# Altium integrated library Altium_WCAP-ATUL_rev19a.IntLib: 117 symbols (continued)
## 860040575009
designator C?, comment 330uF, 35V
WCAP-ATUL THT Aluminum Electrolytic Capacitors, D10mm x L16mm, 330uF, +/-20%, 35VDC; Part Number: 860040575009; Dissipation Factor: 12%; Endurance: 7000h; Leakage Current: 115.5uA; Ripple Current max.: 1380mA; Technical Reference: ATDF160331M035DSPAAG000; ComponentLink1Description: Manufacturer; ComponentLink1URL: http://www.we-online.de; ComponentLink2Description: Datasheet; ComponentLink2URL: https://katalog.we-online.com/pbs/datasheet/860040575009.pdf; Length: 16mm; Mounting Technology: THT; Operating Temperature: -40 to +105degC; Packaging: Ammo Pack; Published Date: August 2019; Capacitance: 330uF; Diameter: 10mm; Publisher: Wurth Elektronik; Capacitance Tolerance: +/-20%; Rated Voltage: 35VDC
footprint WCAP-ATUL_10x16
pins: 1 N, 2 P

## 860040575010
designator C?, comment 470uF, 35V
WCAP-ATUL THT Aluminum Electrolytic Capacitors, D10mm x L20mm, 470uF, +/-20%, 35VDC; Part Number: 860040575010; Dissipation Factor: 12%; Endurance: 7000h; Leakage Current: 164.5uA; Ripple Current max.: 1800mA; Technical Reference: ATDF200471M035DSPAAG000; ComponentLink1Description: Manufacturer; ComponentLink1URL: http://www.we-online.de; ComponentLink2Description: Datasheet; ComponentLink2URL: https://katalog.we-online.com/pbs/datasheet/860040575010.pdf; Length: 20mm; Mounting Technology: THT; Operating Temperature: -40 to +105degC; Packaging: Ammo Pack; Published Date: August 2019; Capacitance: 470uF; Diameter: 10mm; Publisher: Wurth Elektronik; Capacitance Tolerance: +/-20%; Rated Voltage: 35VDC
footprint WCAP-ATUL_10x20
pins: 1 N, 2 P

## 860040575011
designator C?, comment 560uF, 35V
WCAP-ATUL THT Aluminum Electrolytic Capacitors, D10mm x L25mm, 560uF, +/-20%, 35VDC; Part Number: 860040575011; Dissipation Factor: 12%; Endurance: 7000h; Leakage Current: 196uA; Ripple Current max.: 1900mA; Technical Reference: ATDF250561M035DSPAAG000; ComponentLink1Description: Manufacturer; ComponentLink1URL: http://www.we-online.de; ComponentLink2Description: Datasheet; ComponentLink2URL: https://katalog.we-online.com/pbs/datasheet/860040575011.pdf; Length: 25mm; Mounting Technology: THT; Operating Temperature: -40 to +105degC; Packaging: Ammo Pack; Published Date: August 2019; Capacitance: 560uF; Diameter: 10mm; Publisher: Wurth Elektronik; Capacitance Tolerance: +/-20%; Rated Voltage: 35VDC
footprint WCAP-ATUL_10x25
pins: 1 N, 2 P

## 860040575012
designator C?, comment 680uF, 35V
WCAP-ATUL THT Aluminum Electrolytic Capacitors, D10mm x L30mm, 680uF, +/-20%, 35VDC; Part Number: 860040575012; Dissipation Factor: 12%; Endurance: 7000h; Leakage Current: 238uA; Ripple Current max.: 2000mA; Technical Reference: ATDF300681M035DSPAAG000; ComponentLink1Description: Manufacturer; ComponentLink1URL: http://www.we-online.de; ComponentLink2Description: Datasheet; ComponentLink2URL: https://katalog.we-online.com/pbs/datasheet/860040575012.pdf; Length: 30mm; Mounting Technology: THT; Operating Temperature: -40 to +105degC; Packaging: Ammo Pack; Published Date: August 2019; Capacitance: 680uF; Diameter: 10mm; Publisher: Wurth Elektronik; Capacitance Tolerance: +/-20%; Rated Voltage: 35VDC
footprint WCAP-ATUL_10x30
pins: 1 N, 2 P

## 860040578013
designator C?, comment 680uF, 35V
WCAP-ATUL THT Aluminum Electrolytic Capacitors, D13mm x L20mm, 680uF, +/-20%, 35VDC; Part Number: 860040578013; Dissipation Factor: 12%; Endurance: 10000h; Leakage Current: 238uA; Ripple Current max.: 2100mA; Technical Reference: ATDI200681M035DSPACK000; ComponentLink1Description: Manufacturer; ComponentLink1URL: http://www.we-online.de; ComponentLink2Description: Datasheet; ComponentLink2URL: https://katalog.we-online.com/pbs/datasheet/860040578013.pdf; Length: 20mm; Mounting Technology: THT; Operating Temperature: -40 to +105degC; Packaging: Ammo Pack; Published Date: August 2019; Capacitance: 680uF; Diameter: 13mm; Publisher: Wurth Elektronik; Capacitance Tolerance: +/-20%; Rated Voltage: 35VDC
footprint WCAP-ATUL_13x20
pins: 1 N, 2 P

## 860040578014
designator C?, comment 1000uF, 35V
WCAP-ATUL THT Aluminum Electrolytic Capacitors, D13mm x L25mm, 1000uF, +/-20%, 35VDC; Part Number: 860040578014; Dissipation Factor: 12%; Endurance: 10000h; Leakage Current: 350uA; Ripple Current max.: 2400mA; Technical Reference: ATDI250102M035DSPACK000; ComponentLink1Description: Manufacturer; ComponentLink1URL: http://www.we-online.de; ComponentLink2Description: Datasheet; ComponentLink2URL: https://katalog.we-online.com/pbs/datasheet/860040578014.pdf; Length: 25mm; Mounting Technology: THT; Operating Temperature: -40 to +105degC; Packaging: Ammo Pack; Published Date: August 2019; Capacitance: 1000uF; Diameter: 13mm; Publisher: Wurth Elektronik; Capacitance Tolerance: +/-20%; Rated Voltage: 35VDC
footprint WCAP-ATUL_13x25
pins: 1 N, 2 P

## 860040578015
designator C?, comment 1200uF, 35V
WCAP-ATUL THT Aluminum Electrolytic Capacitors, D13mm x L30mm, 1200uF, +/-20%, 35VDC; Part Number: 860040578015; Dissipation Factor: 12%; Endurance: 10000h; Leakage Current: 420uA; Ripple Current max.: 2800mA; Technical Reference: ATDI300122M035DSPACK000; ComponentLink1Description: Manufacturer; ComponentLink1URL: http://www.we-online.de; ComponentLink2Description: Datasheet; ComponentLink2URL: https://katalog.we-online.com/pbs/datasheet/860040578015.pdf; Length: 30mm; Mounting Technology: THT; Operating Temperature: -40 to +105degC; Packaging: Ammo Pack; Published Date: August 2019; Capacitance: 1200uF; Diameter: 13mm; Publisher: Wurth Elektronik; Capacitance Tolerance: +/-20%; Rated Voltage: 35VDC
footprint WCAP-ATUL_13x30
pins: 1 N, 2 P

## 860040578017
designator C?, comment 1500uF, 35V
WCAP-ATUL THT Aluminum Electrolytic Capacitors, D13mm x L35mm, 1500uF, +/-20%, 35VDC; Part Number: 860040578017; Dissipation Factor: 12%; Endurance: 10000h; Leakage Current: 525uA; Ripple Current max.: 3000mA; Technical Reference: ATDI350152M035DSPABK000; ComponentLink1Description: Manufacturer; ComponentLink1URL: http://www.we-online.de; ComponentLink2Description: Datasheet; ComponentLink2URL: https://katalog.we-online.com/pbs/datasheet/860040578017.pdf; Length: 35mm; Mounting Technology: THT; Operating Temperature: -40 to +105degC; Packaging: Ammo Pack; Published Date: August 2019; Capacitance: 1500uF; Diameter: 13mm; Publisher: Wurth Elektronik; Capacitance Tolerance: +/-20%; Rated Voltage: 35VDC
footprint WCAP-ATUL_13x35
pins: 1 N, 2 P

## 860040580016
designator C?, comment 1200uF, 35V
WCAP-ATUL THT Aluminum Electrolytic Capacitors, D16mm x L21mm, 1200uF, +/-20%, 35VDC; Part Number: 860040580016; Dissipation Factor: 12%; Endurance: 10000h; Leakage Current: 420uA; Ripple Current max.: 2800mA; Technical Reference: ATDK210122M035DSPAEK000; ComponentLink1Description: Manufacturer; ComponentLink1URL: http://www.we-online.de; ComponentLink2Description: Datasheet; ComponentLink2URL: https://katalog.we-online.com/pbs/datasheet/860040580016.pdf; Length: 21mm; Mounting Technology: THT; Operating Temperature: -40 to +105degC; Packaging: Ammo Pack; Published Date: August 2019; Capacitance: 1200uF; Diameter: 16mm; Publisher: Wurth Elektronik; Capacitance Tolerance: +/-20%; Rated Voltage: 35VDC
footprint WCAP-ATUL_16x21
pins: 1 N, 2 P

## 860040580018
designator C?, comment 1800uF, 35V
WCAP-ATUL THT Aluminum Electrolytic Capacitors, D16mm x L25mm, 1800uF, +/-20%, 35VDC; Part Number: 860040580018; Dissipation Factor: 12%; Endurance: 10000h; Leakage Current: 630uA; Ripple Current max.: 2800mA; Technical Reference: ATDK250182M035DSPAEK000; ComponentLink1Description: Manufacturer; ComponentLink1URL: http://www.we-online.de; ComponentLink2Description: Datasheet; ComponentLink2URL: https://katalog.we-online.com/pbs/datasheet/860040580018.pdf; Length: 25mm; Mounting Technology: THT; Operating Temperature: -40 to +105degC; Packaging: Ammo Pack; Published Date: August 2019; Capacitance: 1800uF; Diameter: 16mm; Publisher: Wurth Elektronik; Capacitance Tolerance: +/-20%; Rated Voltage: 35VDC
footprint WCAP-ATUL_16x25
pins: 1 N, 2 P

## 860040580019
designator C?, comment 2700uF, 35V
WCAP-ATUL THT Aluminum Electrolytic Capacitors, D16mm x L35.5mm, 2700uF, +/-20%, 35VDC; Part Number: 860040580019; Dissipation Factor: 14%; Endurance: 10000h; Leakage Current: 945uA; Ripple Current max.: 3500mA; Technical Reference: ATDK355272M035DSPADK000; ComponentLink1Description: Manufacturer; ComponentLink1URL: http://www.we-online.de; ComponentLink2Description: Datasheet; ComponentLink2URL: https://katalog.we-online.com/pbs/datasheet/860040580019.pdf; Length: 35.5mm; Mounting Technology: THT; Operating Temperature: -40 to +105degC; Packaging: Ammo Pack; Published Date: August 2019; Capacitance: 2700uF; Diameter: 16mm; Publisher: Wurth Elektronik; Capacitance Tolerance: +/-20%; Rated Voltage: 35VDC
footprint WCAP-ATUL_16x35.5
pins: 1 N, 2 P

## 860040581020
designator C?, comment 2700uF, 35V
WCAP-ATUL THT Aluminum Electrolytic Capacitors, D18mm x L31.5mm, 2700uF, +/-20%, 35VDC; Part Number: 860040581020; Dissipation Factor: 14%; Endurance: 10000h; Leakage Current: 945uA; Ripple Current max.: 3850mA; Technical Reference: ATDL315272M035DSPAEK000; ComponentLink1Description: Manufacturer; ComponentLink1URL: http://www.we-online.de; ComponentLink2Description: Datasheet; ComponentLink2URL: https://katalog.we-online.com/pbs/datasheet/860040581020.pdf; Length: 31.5mm; Mounting Technology: THT; Operating Temperature: -40 to +105degC; Packaging: Ammo Pack; Published Date: August 2019; Capacitance: 2700uF; Diameter: 18mm; Publisher: Wurth Elektronik; Capacitance Tolerance: +/-20%; Rated Voltage: 35VDC
footprint WCAP-ATUL_18x31.5
pins: 1 N, 2 P

## 860040672001
designator C?, comment 22uF, 50V
WCAP-ATUL THT Aluminum Electrolytic Capacitors, D5mm x L11mm, 22uF, +/-20%, 50VDC; Part Number: 860040672001; Dissipation Factor: 10%; Endurance: 5000h; Leakage Current: 11uA; Ripple Current max.: 220mA; Technical Reference: ATDC110220M050DSPA3E000; ComponentLink1Description: Manufacturer; ComponentLink1URL: http://www.we-online.de; ComponentLink2Description: Datasheet; ComponentLink2URL: https://katalog.we-online.com/pbs/datasheet/860040672001.pdf; Length: 11mm; Mounting Technology: THT; Operating Temperature: -40 to +105degC; Packaging: Ammo Pack; Published Date: August 2019; Capacitance: 22uF; Diameter: 5mm; Publisher: Wurth Elektronik; Capacitance Tolerance: +/-20%; Rated Voltage: 50VDC
footprint WCAP-ATUL_5x11
pins: 1 N, 2 P

## 860040673002
designator C?, comment 47uF, 50V
WCAP-ATUL THT Aluminum Electrolytic Capacitors, D6.3mm x L11mm, 47uF, +/-20%, 50VDC; Part Number: 860040673002; Dissipation Factor: 10%; Endurance: 5000h; Leakage Current: 23.5uA; Ripple Current max.: 260mA; Technical Reference: ATDD110470M050DSPA4E000; ComponentLink1Description: Manufacturer; ComponentLink1URL: http://www.we-online.de; ComponentLink2Description: Datasheet; ComponentLink2URL: https://katalog.we-online.com/pbs/datasheet/860040673002.pdf; Length: 11mm; Mounting Technology: THT; Operating Temperature: -40 to +105degC; Packaging: Ammo Pack; Published Date: August 2019; Capacitance: 47uF; Diameter: 6.3mm; Publisher: Wurth Elektronik; Capacitance Tolerance: +/-20%; Rated Voltage: 50VDC
footprint WCAP-ATUL_6.3x11
pins: 1 N, 2 P

## 860040673003
designator C?, comment 56uF, 50V
WCAP-ATUL THT Aluminum Electrolytic Capacitors, D6.3mm x L11mm, 56uF, +/-20%, 50VDC; Part Number: 860040673003; Dissipation Factor: 10%; Endurance: 5000h; Leakage Current: 28uA; Ripple Current max.: 300mA; Technical Reference: ATDD110560M050DSPA4E000; ComponentLink1Description: Manufacturer; ComponentLink1URL: http://www.we-online.de; ComponentLink2Description: Datasheet; ComponentLink2URL: https://katalog.we-online.com/pbs/datasheet/860040673003.pdf; Length: 11mm; Mounting Technology: THT; Operating Temperature: -40 to +105degC; Packaging: Ammo Pack; Published Date: August 2019; Capacitance: 56uF; Diameter: 6.3mm; Publisher: Wurth Elektronik; Capacitance Tolerance: +/-20%; Rated Voltage: 50VDC
footprint WCAP-ATUL_6.3x11
pins: 1 N, 2 P

## 860040674004
designator C?, comment 100uF, 50V
WCAP-ATUL THT Aluminum Electrolytic Capacitors, D8mm x L11.5mm, 100uF, +/-20%, 50VDC; Part Number: 860040674004; Dissipation Factor: 10%; Endurance: 7000h; Leakage Current: 50uA; Ripple Current max.: 680mA; Technical Reference: ATDE115101M050DSPA7G000; ComponentLink1Description: Manufacturer; ComponentLink1URL: http://www.we-online.de; ComponentLink2Description: Datasheet; ComponentLink2URL: https://katalog.we-online.com/pbs/datasheet/860040674004.pdf; Length: 11.5mm; Mounting Technology: THT; Operating Temperature: -40 to +105degC; Packaging: Ammo Pack; Published Date: August 2019; Capacitance: 100uF; Diameter: 8mm; Publisher: Wurth Elektronik; Capacitance Tolerance: +/-20%; Rated Voltage: 50VDC
footprint WCAP-ATUL_8x11.5
pins: 1 N, 2 P

## 860040674005
designator C?, comment 120uF, 50V
WCAP-ATUL THT Aluminum Electrolytic Capacitors, D8mm x L16mm, 120uF, +/-20%, 50VDC; Part Number: 860040674005; Dissipation Factor: 10%; Endurance: 7000h; Leakage Current: 60uA; Ripple Current max.: 760mA; Technical Reference: ATDE160121M050DSPA7G000; ComponentLink1Description: Manufacturer; ComponentLink1URL: http://www.we-online.de; ComponentLink2Description: Datasheet; ComponentLink2URL: https://katalog.we-online.com/pbs/datasheet/860040674005.pdf; Length: 16mm; Mounting Technology: THT; Operating Temperature: -40 to +105degC; Packaging: Ammo Pack; Published Date: August 2019; Capacitance: 120uF; Diameter: 8mm; Publisher: Wurth Elektronik; Capacitance Tolerance: +/-20%; Rated Voltage: 50VDC
footprint WCAP-ATUL_8x16
pins: 1 N, 2 P

## 860040674007
designator C?, comment 180uF, 50V
WCAP-ATUL THT Aluminum Electrolytic Capacitors, D8mm x L20mm, 180uF, +/-20%, 50VDC; Part Number: 860040674007; Dissipation Factor: 10%; Endurance: 7000h; Leakage Current: 90uA; Ripple Current max.: 1000mA; Technical Reference: ATDE200181M050DSPA7G000; ComponentLink1Description: Manufacturer; ComponentLink1URL: http://www.we-online.de; ComponentLink2Description: Datasheet; ComponentLink2URL: https://katalog.we-online.com/pbs/datasheet/860040674007.pdf; Length: 20mm; Mounting Technology: THT; Operating Temperature: -40 to +105degC; Packaging: Ammo Pack; Published Date: August 2019; Capacitance: 180uF; Diameter: 8mm; Publisher: Wurth Elektronik; Capacitance Tolerance: +/-20%; Rated Voltage: 50VDC
footprint WCAP-ATUL_8x20
pins: 1 N, 2 P

## 860040675006
designator C?, comment 150uF, 50V
WCAP-ATUL THT Aluminum Electrolytic Capacitors, D10mm x L12.5mm, 150uF, +/-20%, 50VDC; Part Number: 860040675006; Dissipation Factor: 10%; Endurance: 7000h; Leakage Current: 75uA; Ripple Current max.: 800mA; Technical Reference: ATDF125151M050DSPA9G000; ComponentLink1Description: Manufacturer; ComponentLink1URL: http://www.we-online.de; ComponentLink2Description: Datasheet; ComponentLink2URL: https://katalog.we-online.com/pbs/datasheet/860040675006.pdf; Length: 12.5mm; Mounting Technology: THT; Operating Temperature: -40 to +105degC; Packaging: Ammo Pack; Published Date: August 2019; Capacitance: 150uF; Diameter: 10mm; Publisher: Wurth Elektronik; Capacitance Tolerance: +/-20%; Rated Voltage: 50VDC
footprint WCAP-ATUL_10x12.5
pins: 1 N, 2 P

## 860040675008
designator C?, comment 220uF, 50V
WCAP-ATUL THT Aluminum Electrolytic Capacitors, D10mm x L16mm, 220uF, +/-20%, 50VDC; Part Number: 860040675008; Dissipation Factor: 10%; Endurance: 7000h; Leakage Current: 110uA; Ripple Current max.: 1300mA; Technical Reference: ATDF160221M050DSPAAG000; ComponentLink1Description: Manufacturer; ComponentLink1URL: http://www.we-online.de; ComponentLink2Description: Datasheet; ComponentLink2URL: https://katalog.we-online.com/pbs/datasheet/860040675008.pdf; Length: 16mm; Mounting Technology: THT; Operating Temperature: -40 to +105degC; Packaging: Ammo Pack; Published Date: August 2019; Capacitance: 220uF; Diameter: 10mm; Publisher: Wurth Elektronik; Capacitance Tolerance: +/-20%; Rated Voltage: 50VDC
footprint WCAP-ATUL_10x16
pins: 1 N, 2 P

## 860040675009
designator C?, comment 270uF, 50V
WCAP-ATUL THT Aluminum Electrolytic Capacitors, D10mm x L20mm, 270uF, +/-20%, 50VDC; Part Number: 860040675009; Dissipation Factor: 10%; Endurance: 7000h; Leakage Current: 135uA; Ripple Current max.: 1350mA; Technical Reference: ATDF200271M050DSPAAG000; ComponentLink1Description: Manufacturer; ComponentLink1URL: http://www.we-online.de; ComponentLink2Description: Datasheet; ComponentLink2URL: https://katalog.we-online.com/pbs/datasheet/860040675009.pdf; Length: 20mm; Mounting Technology: THT; Operating Temperature: -40 to +105degC; Packaging: Ammo Pack; Published Date: August 2019; Capacitance: 270uF; Diameter: 10mm; Publisher: Wurth Elektronik; Capacitance Tolerance: +/-20%; Rated Voltage: 50VDC
footprint WCAP-ATUL_10x20
pins: 1 N, 2 P

## 860040675010
designator C?, comment 330uF, 50V
WCAP-ATUL THT Aluminum Electrolytic Capacitors, D10mm x L25mm, 330uF, +/-20%, 50VDC; Part Number: 860040675010; Dissipation Factor: 10%; Endurance: 7000h; Leakage Current: 165uA; Ripple Current max.: 1600mA; Technical Reference: ATDF250331M050DSPAAG000; ComponentLink1Description: Manufacturer; ComponentLink1URL: http://www.we-online.de; ComponentLink2Description: Datasheet; ComponentLink2URL: https://katalog.we-online.com/pbs/datasheet/860040675010.pdf; Length: 25mm; Mounting Technology: THT; Operating Temperature: -40 to +105degC; Packaging: Ammo Pack; Published Date: August 2019; Capacitance: 330uF; Diameter: 10mm; Publisher: Wurth Elektronik; Capacitance Tolerance: +/-20%; Rated Voltage: 50VDC
footprint WCAP-ATUL_10x25
pins: 1 N, 2 P

## 860040675011
designator C?, comment 470uF, 50V
WCAP-ATUL THT Aluminum Electrolytic Capacitors, D10mm x L30mm, 470uF, +/-20%, 50VDC; Part Number: 860040675011; Dissipation Factor: 10%; Endurance: 7000h; Leakage Current: 235uA; Ripple Current max.: 1800mA; Technical Reference: ATDF300471M050DSPAAG000; ComponentLink1Description: Manufacturer; ComponentLink1URL: http://www.we-online.de; ComponentLink2Description: Datasheet; ComponentLink2URL: https://katalog.we-online.com/pbs/datasheet/860040675011.pdf; Length: 30mm; Mounting Technology: THT; Operating Temperature: -40 to +105degC; Packaging: Ammo Pack; Published Date: August 2019; Capacitance: 470uF; Diameter: 10mm; Publisher: Wurth Elektronik; Capacitance Tolerance: +/-20%; Rated Voltage: 50VDC
footprint WCAP-ATUL_10x30
pins: 1 N, 2 P

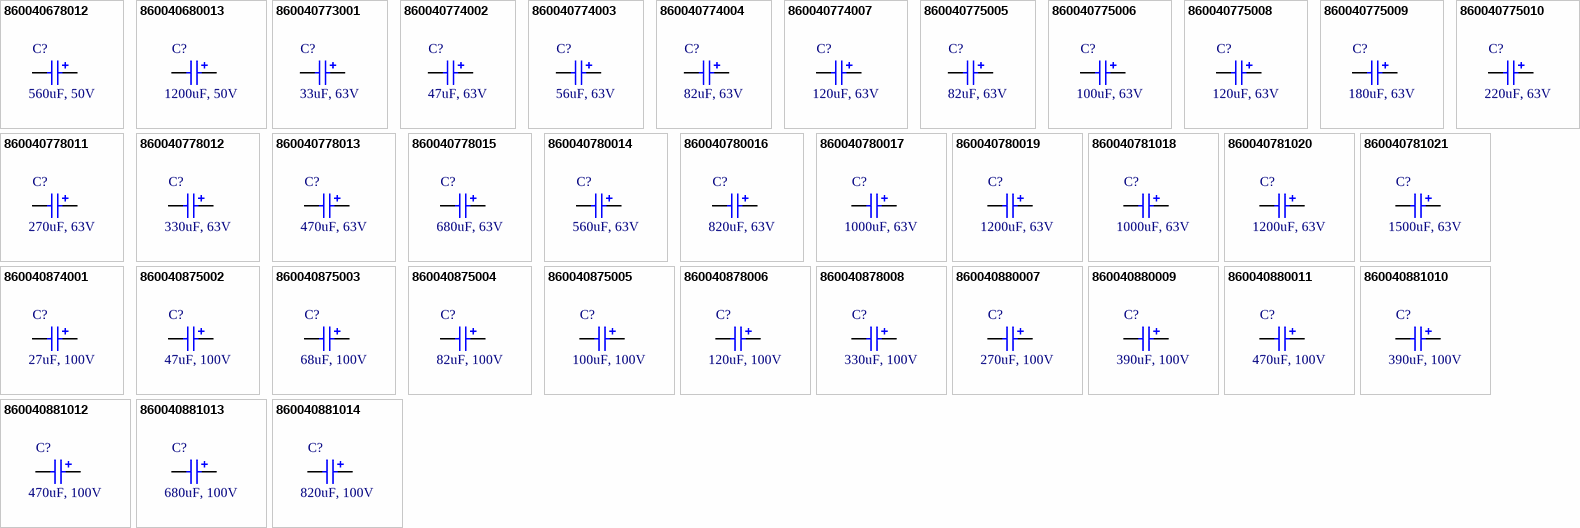
[diagram p2: symbols 860040678012 to 860040881014]

## 860040678012
designator C?, comment 560uF, 50V
WCAP-ATUL THT Aluminum Electrolytic Capacitors, D13mm x L25mm, 560uF, +/-20%, 50VDC; Part Number: 860040678012; Dissipation Factor: 10%; Endurance: 10000h; Leakage Current: 280uA; Ripple Current max.: 1950mA; Technical Reference: ATDI250561M050DSPACK000; ComponentLink1Description: Manufacturer; ComponentLink1URL: http://www.we-online.de; ComponentLink2Description: Datasheet; ComponentLink2URL: https://katalog.we-online.com/pbs/datasheet/860040678012.pdf; Length: 25mm; Mounting Technology: THT; Operating Temperature: -40 to +105degC; Packaging: Ammo Pack; Published Date: August 2019; Capacitance: 560uF; Diameter: 13mm; Publisher: Wurth Elektronik; Capacitance Tolerance: +/-20%; Rated Voltage: 50VDC
footprint WCAP-ATUL_13x25
pins: 1 N, 2 P

## 860040680013
designator C?, comment 1200uF, 50V
WCAP-ATUL THT Aluminum Electrolytic Capacitors, D16mm x L31.5mm, 1200uF, +/-20%, 50VDC; Part Number: 860040680013; Dissipation Factor: 10%; Endurance: 10000h; Leakage Current: 600uA; Ripple Current max.: 2870mA; Technical Reference: ATDK315122M050DSPADK000; ComponentLink1Description: Manufacturer; ComponentLink1URL: http://www.we-online.de; ComponentLink2Description: Datasheet; ComponentLink2URL: https://katalog.we-online.com/pbs/datasheet/860040680013.pdf; Length: 31.5mm; Mounting Technology: THT; Operating Temperature: -40 to +105degC; Packaging: Ammo Pack; Published Date: August 2019; Capacitance: 1200uF; Diameter: 16mm; Publisher: Wurth Elektronik; Capacitance Tolerance: +/-20%; Rated Voltage: 50VDC
footprint WCAP-ATUL_16x31.5
pins: 1 N, 2 P

## 860040773001
designator C?, comment 33uF, 63V
WCAP-ATUL THT Aluminum Electrolytic Capacitors, D6.3mm x L11mm, 33uF, +/-20%, 63VDC; Part Number: 860040773001; Dissipation Factor: 9%; Endurance: 5000h; Leakage Current: 20.79uA; Ripple Current max.: 260mA; Technical Reference: ATDD110330M063DSPA4E000; ComponentLink1Description: Manufacturer; ComponentLink1URL: http://www.we-online.de; ComponentLink2Description: Datasheet; ComponentLink2URL: https://katalog.we-online.com/pbs/datasheet/860040773001.pdf; Length: 11mm; Mounting Technology: THT; Operating Temperature: -40 to +105degC; Packaging: Ammo Pack; Published Date: August 2019; Capacitance: 33uF; Diameter: 6.3mm; Publisher: Wurth Elektronik; Capacitance Tolerance: +/-20%; Rated Voltage: 63VDC
footprint WCAP-ATUL_6.3x11
pins: 1 N, 2 P

## 860040774002
designator C?, comment 47uF, 63V
WCAP-ATUL THT Aluminum Electrolytic Capacitors, D8mm x L11.5mm, 47uF, +/-20%, 63VDC; Part Number: 860040774002; Dissipation Factor: 9%; Endurance: 7000h; Leakage Current: 29.61uA; Ripple Current max.: 360mA; Technical Reference: ATDE115470M063DSPA7G000; ComponentLink1Description: Manufacturer; ComponentLink1URL: http://www.we-online.de; ComponentLink2Description: Datasheet; ComponentLink2URL: https://katalog.we-online.com/pbs/datasheet/860040774002.pdf; Length: 11.5mm; Mounting Technology: THT; Operating Temperature: -40 to +105degC; Packaging: Ammo Pack; Published Date: August 2019; Capacitance: 47uF; Diameter: 8mm; Publisher: Wurth Elektronik; Capacitance Tolerance: +/-20%; Rated Voltage: 63VDC
footprint WCAP-ATUL_8x11.5
pins: 1 N, 2 P

## 860040774003
designator C?, comment 56uF, 63V
WCAP-ATUL THT Aluminum Electrolytic Capacitors, D8mm x L11.5mm, 56uF, +/-20%, 63VDC; Part Number: 860040774003; Dissipation Factor: 9%; Endurance: 7000h; Leakage Current: 35.28uA; Ripple Current max.: 380mA; Technical Reference: ATDE115560M063DSPA7G000; ComponentLink1Description: Manufacturer; ComponentLink1URL: http://www.we-online.de; ComponentLink2Description: Datasheet; ComponentLink2URL: https://katalog.we-online.com/pbs/datasheet/860040774003.pdf; Length: 11.5mm; Mounting Technology: THT; Operating Temperature: -40 to +105degC; Packaging: Ammo Pack; Published Date: August 2019; Capacitance: 56uF; Diameter: 8mm; Publisher: Wurth Elektronik; Capacitance Tolerance: +/-20%; Rated Voltage: 63VDC
footprint WCAP-ATUL_8x11.5
pins: 1 N, 2 P

## 860040774004
designator C?, comment 82uF, 63V
WCAP-ATUL THT Aluminum Electrolytic Capacitors, D8mm x L16mm, 82uF, +/-20%, 63VDC; Part Number: 860040774004; Dissipation Factor: 9%; Endurance: 7000h; Leakage Current: 51.66uA; Ripple Current max.: 460mA; Technical Reference: ATDE160820M063DSPA7G000; ComponentLink1Description: Manufacturer; ComponentLink1URL: http://www.we-online.de; ComponentLink2Description: Datasheet; ComponentLink2URL: https://katalog.we-online.com/pbs/datasheet/860040774004.pdf; Length: 16mm; Mounting Technology: THT; Operating Temperature: -40 to +105degC; Packaging: Ammo Pack; Published Date: August 2019; Capacitance: 82uF; Diameter: 8mm; Publisher: Wurth Elektronik; Capacitance Tolerance: +/-20%; Rated Voltage: 63VDC
footprint WCAP-ATUL_8x16
pins: 1 N, 2 P

## 860040774007
designator C?, comment 120uF, 63V
WCAP-ATUL THT Aluminum Electrolytic Capacitors, D8mm x L20mm, 120uF, +/-20%, 63VDC; Part Number: 860040774007; Dissipation Factor: 9%; Endurance: 7000h; Leakage Current: 75.6uA; Ripple Current max.: 700mA; Technical Reference: ATDE200121M063DSPA7G000; ComponentLink1Description: Manufacturer; ComponentLink1URL: http://www.we-online.de; ComponentLink2Description: Datasheet; ComponentLink2URL: https://katalog.we-online.com/pbs/datasheet/860040774007.pdf; Length: 20mm; Mounting Technology: THT; Operating Temperature: -40 to +105degC; Packaging: Ammo Pack; Published Date: August 2019; Capacitance: 120uF; Diameter: 8mm; Publisher: Wurth Elektronik; Capacitance Tolerance: +/-20%; Rated Voltage: 63VDC
footprint WCAP-ATUL_8x20
pins: 1 N, 2 P

## 860040775005
designator C?, comment 82uF, 63V
WCAP-ATUL THT Aluminum Electrolytic Capacitors, D10mm x L12.5mm, 82uF, +/-20%, 63VDC; Part Number: 860040775005; Dissipation Factor: 9%; Endurance: 7000h; Leakage Current: 51.66uA; Ripple Current max.: 500mA; Technical Reference: ATDF125820M063DSPA9G000; ComponentLink1Description: Manufacturer; ComponentLink1URL: http://www.we-online.de; ComponentLink2Description: Datasheet; ComponentLink2URL: https://katalog.we-online.com/pbs/datasheet/860040775005.pdf; Length: 12.5mm; Mounting Technology: THT; Operating Temperature: -40 to +105degC; Packaging: Ammo Pack; Published Date: August 2019; Capacitance: 82uF; Diameter: 10mm; Publisher: Wurth Elektronik; Capacitance Tolerance: +/-20%; Rated Voltage: 63VDC
footprint WCAP-ATUL_10x12.5
pins: 1 N, 2 P

## 860040775006
designator C?, comment 100uF, 63V
WCAP-ATUL THT Aluminum Electrolytic Capacitors, D10mm x L12.5mm, 100uF, +/-20%, 63VDC; Part Number: 860040775006; Dissipation Factor: 9%; Endurance: 7000h; Leakage Current: 63uA; Ripple Current max.: 640mA; Technical Reference: ATDF125101M063DSPA9G000; ComponentLink1Description: Manufacturer; ComponentLink1URL: http://www.we-online.de; ComponentLink2Description: Datasheet; ComponentLink2URL: https://katalog.we-online.com/pbs/datasheet/860040775006.pdf; Length: 12.5mm; Mounting Technology: THT; Operating Temperature: -40 to +105degC; Packaging: Ammo Pack; Published Date: August 2019; Capacitance: 100uF; Diameter: 10mm; Publisher: Wurth Elektronik; Capacitance Tolerance: +/-20%; Rated Voltage: 63VDC
footprint WCAP-ATUL_10x12.5
pins: 1 N, 2 P

## 860040775008
designator C?, comment 120uF, 63V
WCAP-ATUL THT Aluminum Electrolytic Capacitors, D10mm x L16mm, 120uF, +/-20%, 63VDC; Part Number: 860040775008; Dissipation Factor: 9%; Endurance: 7000h; Leakage Current: 75.6uA; Ripple Current max.: 760mA; Technical Reference: ATDF160121M063DSPAAG000; ComponentLink1Description: Manufacturer; ComponentLink1URL: http://www.we-online.de; ComponentLink2Description: Datasheet; ComponentLink2URL: https://katalog.we-online.com/pbs/datasheet/860040775008.pdf; Length: 16mm; Mounting Technology: THT; Operating Temperature: -40 to +105degC; Packaging: Ammo Pack; Published Date: August 2019; Capacitance: 120uF; Diameter: 10mm; Publisher: Wurth Elektronik; Capacitance Tolerance: +/-20%; Rated Voltage: 63VDC
footprint WCAP-ATUL_10x16
pins: 1 N, 2 P

## 860040775009
designator C?, comment 180uF, 63V
WCAP-ATUL THT Aluminum Electrolytic Capacitors, D10mm x L20mm, 180uF, +/-20%, 63VDC; Part Number: 860040775009; Dissipation Factor: 9%; Endurance: 7000h; Leakage Current: 113.4uA; Ripple Current max.: 880mA; Technical Reference: ATDF200181M063DSPAAG000; ComponentLink1Description: Manufacturer; ComponentLink1URL: http://www.we-online.de; ComponentLink2Description: Datasheet; ComponentLink2URL: https://katalog.we-online.com/pbs/datasheet/860040775009.pdf; Length: 20mm; Mounting Technology: THT; Operating Temperature: -40 to +105degC; Packaging: Ammo Pack; Published Date: August 2019; Capacitance: 180uF; Diameter: 10mm; Publisher: Wurth Elektronik; Capacitance Tolerance: +/-20%; Rated Voltage: 63VDC
footprint WCAP-ATUL_10x20
pins: 1 N, 2 P

## 860040775010
designator C?, comment 220uF, 63V
WCAP-ATUL THT Aluminum Electrolytic Capacitors, D10mm x L25mm, 220uF, +/-20%, 63VDC; Part Number: 860040775010; Dissipation Factor: 9%; Endurance: 7000h; Leakage Current: 138.6uA; Ripple Current max.: 1100mA; Technical Reference: ATDF250221M063DSPAAG000; ComponentLink1Description: Manufacturer; ComponentLink1URL: http://www.we-online.de; ComponentLink2Description: Datasheet; ComponentLink2URL: https://katalog.we-online.com/pbs/datasheet/860040775010.pdf; Length: 25mm; Mounting Technology: THT; Operating Temperature: -40 to +105degC; Packaging: Ammo Pack; Published Date: August 2019; Capacitance: 220uF; Diameter: 10mm; Publisher: Wurth Elektronik; Capacitance Tolerance: +/-20%; Rated Voltage: 63VDC
footprint WCAP-ATUL_10x25
pins: 1 N, 2 P

## 860040778011
designator C?, comment 270uF, 63V
WCAP-ATUL THT Aluminum Electrolytic Capacitors, D13mm x L20mm, 270uF, +/-20%, 63VDC; Part Number: 860040778011; Dissipation Factor: 9%; Endurance: 10000h; Leakage Current: 170.1uA; Ripple Current max.: 1200mA; Technical Reference: ATDI200271M063DSPACK000; ComponentLink1Description: Manufacturer; ComponentLink1URL: http://www.we-online.de; ComponentLink2Description: Datasheet; ComponentLink2URL: https://katalog.we-online.com/pbs/datasheet/860040778011.pdf; Length: 20mm; Mounting Technology: THT; Operating Temperature: -40 to +105degC; Packaging: Ammo Pack; Published Date: August 2019; Capacitance: 270uF; Diameter: 13mm; Publisher: Wurth Elektronik; Capacitance Tolerance: +/-20%; Rated Voltage: 63VDC
footprint WCAP-ATUL_13x20
pins: 1 N, 2 P

## 860040778012
designator C?, comment 330uF, 63V
WCAP-ATUL THT Aluminum Electrolytic Capacitors, D13mm x L25mm, 330uF, +/-20%, 63VDC; Part Number: 860040778012; Dissipation Factor: 9%; Endurance: 10000h; Leakage Current: 207.9uA; Ripple Current max.: 1600mA; Technical Reference: ATDI250331M063DSPACK000; ComponentLink1Description: Manufacturer; ComponentLink1URL: http://www.we-online.de; ComponentLink2Description: Datasheet; ComponentLink2URL: https://katalog.we-online.com/pbs/datasheet/860040778012.pdf; Length: 25mm; Mounting Technology: THT; Operating Temperature: -40 to +105degC; Packaging: Ammo Pack; Published Date: August 2019; Capacitance: 330uF; Diameter: 13mm; Publisher: Wurth Elektronik; Capacitance Tolerance: +/-20%; Rated Voltage: 63VDC
footprint WCAP-ATUL_13x25
pins: 1 N, 2 P

## 860040778013
designator C?, comment 470uF, 63V
WCAP-ATUL THT Aluminum Electrolytic Capacitors, D13mm x L30mm, 470uF, +/-20%, 63VDC; Part Number: 860040778013; Dissipation Factor: 9%; Endurance: 10000h; Leakage Current: 296.1uA; Ripple Current max.: 1800mA; Technical Reference: ATDI300471M063DSPACK000; ComponentLink1Description: Manufacturer; ComponentLink1URL: http://www.we-online.de; ComponentLink2Description: Datasheet; ComponentLink2URL: https://katalog.we-online.com/pbs/datasheet/860040778013.pdf; Length: 30mm; Mounting Technology: THT; Operating Temperature: -40 to +105degC; Packaging: Ammo Pack; Published Date: August 2019; Capacitance: 470uF; Diameter: 13mm; Publisher: Wurth Elektronik; Capacitance Tolerance: +/-20%; Rated Voltage: 63VDC
footprint WCAP-ATUL_13x30
pins: 1 N, 2 P

## 860040778015
designator C?, comment 680uF, 63V
WCAP-ATUL THT Aluminum Electrolytic Capacitors, D13mm x L40mm, 680uF, +/-20%, 63VDC; Part Number: 860040778015; Dissipation Factor: 9%; Endurance: 10000h; Leakage Current: 428.4uA; Ripple Current max.: 2200mA; Technical Reference: ATDI400681M063DSPS4K000; ComponentLink1Description: Manufacturer; ComponentLink1URL: http://www.we-online.de; ComponentLink2Description: Datasheet; ComponentLink2URL: https://katalog.we-online.com/pbs/datasheet/860040778015.pdf; Length: 40mm; Mounting Technology: THT; Operating Temperature: -40 to +105degC; Packaging: Ammo Pack; Published Date: August 2019; Capacitance: 680uF; Diameter: 13mm; Publisher: Wurth Elektronik; Capacitance Tolerance: +/-20%; Rated Voltage: 63VDC
footprint WCAP-ATUL_13x40
pins: 1 N, 2 P

## 860040780014
designator C?, comment 560uF, 63V
WCAP-ATUL THT Aluminum Electrolytic Capacitors, D16mm x L25mm, 560uF, +/-20%, 63VDC; Part Number: 860040780014; Dissipation Factor: 9%; Endurance: 10000h; Leakage Current: 352.8uA; Ripple Current max.: 2000mA; Technical Reference: ATDK250561M063DSPAEK000; ComponentLink1Description: Manufacturer; ComponentLink1URL: http://www.we-online.de; ComponentLink2Description: Datasheet; ComponentLink2URL: https://katalog.we-online.com/pbs/datasheet/860040780014.pdf; Length: 25mm; Mounting Technology: THT; Operating Temperature: -40 to +105degC; Packaging: Ammo Pack; Published Date: August 2019; Capacitance: 560uF; Diameter: 16mm; Publisher: Wurth Elektronik; Capacitance Tolerance: +/-20%; Rated Voltage: 63VDC
footprint WCAP-ATUL_16x25
pins: 1 N, 2 P

## 860040780016
designator C?, comment 820uF, 63V
WCAP-ATUL THT Aluminum Electrolytic Capacitors, D16mm x L31.5mm, 820uF, +/-20%, 63VDC; Part Number: 860040780016; Dissipation Factor: 9%; Endurance: 10000h; Leakage Current: 516.6uA; Ripple Current max.: 2400mA; Technical Reference: ATDK315821M063DSPADK000; ComponentLink1Description: Manufacturer; ComponentLink1URL: http://www.we-online.de; ComponentLink2Description: Datasheet; ComponentLink2URL: https://katalog.we-online.com/pbs/datasheet/860040780016.pdf; Length: 31.5mm; Mounting Technology: THT; Operating Temperature: -40 to +105degC; Packaging: Ammo Pack; Published Date: August 2019; Capacitance: 820uF; Diameter: 16mm; Publisher: Wurth Elektronik; Capacitance Tolerance: +/-20%; Rated Voltage: 63VDC
footprint WCAP-ATUL_16x31.5
pins: 1 N, 2 P

## 860040780017
designator C?, comment 1000uF, 63V
WCAP-ATUL THT Aluminum Electrolytic Capacitors, D16mm x L35.5mm, 1000uF, +/-20%, 63VDC; Part Number: 860040780017; Dissipation Factor: 9%; Endurance: 10000h; Leakage Current: 630uA; Ripple Current max.: 2500mA; Technical Reference: ATDK355102M063DSPADK000; ComponentLink1Description: Manufacturer; ComponentLink1URL: http://www.we-online.de; ComponentLink2Description: Datasheet; ComponentLink2URL: https://katalog.we-online.com/pbs/datasheet/860040780017.pdf; Length: 35.5mm; Mounting Technology: THT; Operating Temperature: -40 to +105degC; Packaging: Ammo Pack; Published Date: August 2019; Capacitance: 1000uF; Diameter: 16mm; Publisher: Wurth Elektronik; Capacitance Tolerance: +/-20%; Rated Voltage: 63VDC
footprint WCAP-ATUL_16x35.5
pins: 1 N, 2 P

## 860040780019
designator C?, comment 1200uF, 63V
WCAP-ATUL THT Aluminum Electrolytic Capacitors, D16mm x L41mm, 1200uF, +/-20%, 63VDC; Part Number: 860040780019; Dissipation Factor: 9%; Endurance: 10000h; Leakage Current: 756uA; Ripple Current max.: 2920mA; Technical Reference: ATDK410122M063DSPS3K000; ComponentLink1Description: Manufacturer; ComponentLink1URL: http://www.we-online.de; ComponentLink2Description: Datasheet; ComponentLink2URL: https://katalog.we-online.com/pbs/datasheet/860040780019.pdf; Length: 41mm; Mounting Technology: THT; Operating Temperature: -40 to +105degC; Packaging: Ammo Pack; Published Date: August 2019; Capacitance: 1200uF; Diameter: 16mm; Publisher: Wurth Elektronik; Capacitance Tolerance: +/-20%; Rated Voltage: 63VDC
footprint WCAP-ATUL_16x41
pins: 1 N, 2 P

## 860040781018
designator C?, comment 1000uF, 63V
WCAP-ATUL THT Aluminum Electrolytic Capacitors, D18mm x L31.5mm, 1000uF, +/-20%, 63VDC; Part Number: 860040781018; Dissipation Factor: 9%; Endurance: 10000h; Leakage Current: 630uA; Ripple Current max.: 2800mA; Technical Reference: ATDL315102M063DSPAEK000; ComponentLink1Description: Manufacturer; ComponentLink1URL: http://www.we-online.de; ComponentLink2Description: Datasheet; ComponentLink2URL: https://katalog.we-online.com/pbs/datasheet/860040781018.pdf; Length: 31.5mm; Mounting Technology: THT; Operating Temperature: -40 to +105degC; Packaging: Ammo Pack; Published Date: August 2019; Capacitance: 1000uF; Diameter: 18mm; Publisher: Wurth Elektronik; Capacitance Tolerance: +/-20%; Rated Voltage: 63VDC
footprint WCAP-ATUL_18x31.5
pins: 1 N, 2 P

## 860040781020
designator C?, comment 1200uF, 63V
WCAP-ATUL THT Aluminum Electrolytic Capacitors, D18mm x L35.5mm, 1200uF, +/-20%, 63VDC; Part Number: 860040781020; Dissipation Factor: 9%; Endurance: 10000h; Leakage Current: 756uA; Ripple Current max.: 3000mA; Technical Reference: ATDL355122M063DSPAEK000; ComponentLink1Description: Manufacturer; ComponentLink1URL: http://www.we-online.de; ComponentLink2Description: Datasheet; ComponentLink2URL: https://katalog.we-online.com/pbs/datasheet/860040781020.pdf; Length: 35.5mm; Mounting Technology: THT; Operating Temperature: -40 to +105degC; Packaging: Ammo Pack; Published Date: August 2019; Capacitance: 1200uF; Diameter: 18mm; Publisher: Wurth Elektronik; Capacitance Tolerance: +/-20%; Rated Voltage: 63VDC
footprint WCAP-ATUL_18x35.5
pins: 1 N, 2 P

## 860040781021
designator C?, comment 1500uF, 63V
WCAP-ATUL THT Aluminum Electrolytic Capacitors, D18mm x L41mm, 1500uF, +/-20%, 63VDC; Part Number: 860040781021; Dissipation Factor: 9%; Endurance: 10000h; Leakage Current: 945uA; Ripple Current max.: 3200mA; Technical Reference: ATDL410152M063DSPS1K000; ComponentLink1Description: Manufacturer; ComponentLink1URL: http://www.we-online.de; ComponentLink2Description: Datasheet; ComponentLink2URL: https://katalog.we-online.com/pbs/datasheet/860040781021.pdf; Length: 41mm; Mounting Technology: THT; Operating Temperature: -40 to +105degC; Packaging: Ammo Pack; Published Date: August 2019; Capacitance: 1500uF; Diameter: 18mm; Publisher: Wurth Elektronik; Capacitance Tolerance: +/-20%; Rated Voltage: 63VDC
footprint WCAP-ATUL_18x41
pins: 1 N, 2 P

## 860040874001
designator C?, comment 27uF, 100V
WCAP-ATUL THT Aluminum Electrolytic Capacitors, D8mm x L11.5mm, 27uF, +/-20%, 100VDC; Part Number: 860040874001; Dissipation Factor: 9%; Endurance: 7000h; Leakage Current: 27uA; Ripple Current max.: 300mA; Technical Reference: ATDE115270M100DSPA7G000; ComponentLink1Description: Manufacturer; ComponentLink1URL: http://www.we-online.de; ComponentLink2Description: Datasheet; ComponentLink2URL: https://katalog.we-online.com/pbs/datasheet/860040874001.pdf; Length: 11.5mm; Mounting Technology: THT; Operating Temperature: -40 to +105degC; Packaging: Ammo Pack; Published Date: August 2019; Capacitance: 27uF; Diameter: 8mm; Publisher: Wurth Elektronik; Capacitance Tolerance: +/-20%; Rated Voltage: 100VDC
footprint WCAP-ATUL_8x11.5
pins: 1 N, 2 P

## 860040875002
designator C?, comment 47uF, 100V
WCAP-ATUL THT Aluminum Electrolytic Capacitors, D10mm x L12.5mm, 47uF, +/-20%, 100VDC; Part Number: 860040875002; Dissipation Factor: 9%; Endurance: 7000h; Leakage Current: 47uA; Ripple Current max.: 400mA; Technical Reference: ATDF125470M100DSPA9G000; ComponentLink1Description: Manufacturer; ComponentLink1URL: http://www.we-online.de; ComponentLink2Description: Datasheet; ComponentLink2URL: https://katalog.we-online.com/pbs/datasheet/860040875002.pdf; Length: 12.5mm; Mounting Technology: THT; Operating Temperature: -40 to +105degC; Packaging: Ammo Pack; Published Date: August 2019; Capacitance: 47uF; Diameter: 10mm; Publisher: Wurth Elektronik; Capacitance Tolerance: +/-20%; Rated Voltage: 100VDC
footprint WCAP-ATUL_10x12.5
pins: 1 N, 2 P

## 860040875003
designator C?, comment 68uF, 100V
WCAP-ATUL THT Aluminum Electrolytic Capacitors, D10mm x L16mm, 68uF, +/-20%, 100VDC; Part Number: 860040875003; Dissipation Factor: 9%; Endurance: 7000h; Leakage Current: 68uA; Ripple Current max.: 460mA; Technical Reference: ATDF160680M100DSPAAG000; ComponentLink1Description: Manufacturer; ComponentLink1URL: http://www.we-online.de; ComponentLink2Description: Datasheet; ComponentLink2URL: https://katalog.we-online.com/pbs/datasheet/860040875003.pdf; Length: 16mm; Mounting Technology: THT; Operating Temperature: -40 to +105degC; Packaging: Ammo Pack; Published Date: August 2019; Capacitance: 68uF; Diameter: 10mm; Publisher: Wurth Elektronik; Capacitance Tolerance: +/-20%; Rated Voltage: 100VDC
footprint WCAP-ATUL_10x16
pins: 1 N, 2 P

## 860040875004
designator C?, comment 82uF, 100V
WCAP-ATUL THT Aluminum Electrolytic Capacitors, D10mm x L20mm, 82uF, +/-20%, 100VDC; Part Number: 860040875004; Dissipation Factor: 9%; Endurance: 7000h; Leakage Current: 82uA; Ripple Current max.: 600mA; Technical Reference: ATDF200820M100DSPAAG000; ComponentLink1Description: Manufacturer; ComponentLink1URL: http://www.we-online.de; ComponentLink2Description: Datasheet; ComponentLink2URL: https://katalog.we-online.com/pbs/datasheet/860040875004.pdf; Length: 20mm; Mounting Technology: THT; Operating Temperature: -40 to +105degC; Packaging: Ammo Pack; Published Date: August 2019; Capacitance: 82uF; Diameter: 10mm; Publisher: Wurth Elektronik; Capacitance Tolerance: +/-20%; Rated Voltage: 100VDC
footprint WCAP-ATUL_10x20
pins: 1 N, 2 P

## 860040875005
designator C?, comment 100uF, 100V
WCAP-ATUL THT Aluminum Electrolytic Capacitors, D10mm x L25mm, 100uF, +/-20%, 100VDC; Part Number: 860040875005; Dissipation Factor: 9%; Endurance: 7000h; Leakage Current: 100uA; Ripple Current max.: 800mA; Technical Reference: ATDF250101M100DSPAAG000; ComponentLink1Description: Manufacturer; ComponentLink1URL: http://www.we-online.de; ComponentLink2Description: Datasheet; ComponentLink2URL: https://katalog.we-online.com/pbs/datasheet/860040875005.pdf; Length: 25mm; Mounting Technology: THT; Operating Temperature: -40 to +105degC; Packaging: Ammo Pack; Published Date: August 2019; Capacitance: 100uF; Diameter: 10mm; Publisher: Wurth Elektronik; Capacitance Tolerance: +/-20%; Rated Voltage: 100VDC
footprint WCAP-ATUL_10x25
pins: 1 N, 2 P

## 860040878006
designator C?, comment 120uF, 100V
WCAP-ATUL THT Aluminum Electrolytic Capacitors, D13mm x L20mm, 120uF, +/-20%, 100VDC; Part Number: 860040878006; Dissipation Factor: 9%; Endurance: 10000h; Leakage Current: 120uA; Ripple Current max.: 900mA; Technical Reference: ATDI200121M100DSPACK000; ComponentLink1Description: Manufacturer; ComponentLink1URL: http://www.we-online.de; ComponentLink2Description: Datasheet; ComponentLink2URL: https://katalog.we-online.com/pbs/datasheet/860040878006.pdf; Length: 20mm; Mounting Technology: THT; Operating Temperature: -40 to +105degC; Packaging: Ammo Pack; Published Date: August 2019; Capacitance: 120uF; Diameter: 13mm; Publisher: Wurth Elektronik; Capacitance Tolerance: +/-20%; Rated Voltage: 100VDC
footprint WCAP-ATUL_13x20
pins: 1 N, 2 P

## 860040878008
designator C?, comment 330uF, 100V
WCAP-ATUL THT Aluminum Electrolytic Capacitors, D13mm x L40mm, 330uF, +/-20%, 100VDC; Part Number: 860040878008; Dissipation Factor: 9%; Endurance: 10000h; Leakage Current: 330uA; Ripple Current max.: 1600mA; Technical Reference: ATDI400331M100DSPS4K000; ComponentLink1Description: Manufacturer; ComponentLink1URL: http://www.we-online.de; ComponentLink2Description: Datasheet; ComponentLink2URL: https://katalog.we-online.com/pbs/datasheet/860040878008.pdf; Length: 40mm; Mounting Technology: THT; Operating Temperature: -40 to +105degC; Packaging: Ammo Pack; Published Date: August 2019; Capacitance: 330uF; Diameter: 13mm; Publisher: Wurth Elektronik; Capacitance Tolerance: +/-20%; Rated Voltage: 100VDC
footprint WCAP-ATUL_13x40
pins: 1 N, 2 P

## 860040880007
designator C?, comment 270uF, 100V
WCAP-ATUL THT Aluminum Electrolytic Capacitors, D16mm x L25mm, 270uF, +/-20%, 100VDC; Part Number: 860040880007; Dissipation Factor: 9%; Endurance: 10000h; Leakage Current: 270uA; Ripple Current max.: 1480mA; Technical Reference: ATDK250271M100DSPAEK000; ComponentLink1Description: Manufacturer; ComponentLink1URL: http://www.we-online.de; ComponentLink2Description: Datasheet; ComponentLink2URL: https://katalog.we-online.com/pbs/datasheet/860040880007.pdf; Length: 25mm; Mounting Technology: THT; Operating Temperature: -40 to +105degC; Packaging: Ammo Pack; Published Date: August 2019; Capacitance: 270uF; Diameter: 16mm; Publisher: Wurth Elektronik; Capacitance Tolerance: +/-20%; Rated Voltage: 100VDC
footprint WCAP-ATUL_16x25
pins: 1 N, 2 P

## 860040880009
designator C?, comment 390uF, 100V
WCAP-ATUL THT Aluminum Electrolytic Capacitors, D16mm x L31.5mm, 390uF, +/-20%, 100VDC; Part Number: 860040880009; Dissipation Factor: 9%; Endurance: 10000h; Leakage Current: 390uA; Ripple Current max.: 1700mA; Technical Reference: ATDK315391M100DSPADK000; ComponentLink1Description: Manufacturer; ComponentLink1URL: http://www.we-online.de; ComponentLink2Description: Datasheet; ComponentLink2URL: https://katalog.we-online.com/pbs/datasheet/860040880009.pdf; Length: 31.5mm; Mounting Technology: THT; Operating Temperature: -40 to +105degC; Packaging: Ammo Pack; Published Date: August 2019; Capacitance: 390uF; Diameter: 16mm; Publisher: Wurth Elektronik; Capacitance Tolerance: +/-20%; Rated Voltage: 100VDC
footprint WCAP-ATUL_16x31.5
pins: 1 N, 2 P

## 860040880011
designator C?, comment 470uF, 100V
WCAP-ATUL THT Aluminum Electrolytic Capacitors, D16mm x L35.5mm, 470uF, +/-20%, 100VDC; Part Number: 860040880011; Dissipation Factor: 9%; Endurance: 10000h; Leakage Current: 470uA; Ripple Current max.: 1880mA; Technical Reference: ATDK355471M100DSPADK000; ComponentLink1Description: Manufacturer; ComponentLink1URL: http://www.we-online.de; ComponentLink2Description: Datasheet; ComponentLink2URL: https://katalog.we-online.com/pbs/datasheet/860040880011.pdf; Length: 35.5mm; Mounting Technology: THT; Operating Temperature: -40 to +105degC; Packaging: Ammo Pack; Published Date: August 2019; Capacitance: 470uF; Diameter: 16mm; Publisher: Wurth Elektronik; Capacitance Tolerance: +/-20%; Rated Voltage: 100VDC
footprint WCAP-ATUL_16x35.5
pins: 1 N, 2 P

## 860040881010
designator C?, comment 390uF, 100V
WCAP-ATUL THT Aluminum Electrolytic Capacitors, D18mm x L25mm, 390uF, +/-20%, 100VDC; Part Number: 860040881010; Dissipation Factor: 9%; Endurance: 10000h; Leakage Current: 390uA; Ripple Current max.: 1740mA; Technical Reference: ATDL250391M100DSPAEK000; ComponentLink1Description: Manufacturer; ComponentLink1URL: http://www.we-online.de; ComponentLink2Description: Datasheet; ComponentLink2URL: https://katalog.we-online.com/pbs/datasheet/860040881010.pdf; Length: 25mm; Mounting Technology: THT; Operating Temperature: -40 to +105degC; Packaging: Ammo Pack; Published Date: August 2019; Capacitance: 390uF; Diameter: 18mm; Publisher: Wurth Elektronik; Capacitance Tolerance: +/-20%; Rated Voltage: 100VDC
footprint WCAP-ATUL_18x25
pins: 1 N, 2 P

## 860040881012
designator C?, comment 470uF, 100V
WCAP-ATUL THT Aluminum Electrolytic Capacitors, D18mm x L31.5mm, 470uF, +/-20%, 100VDC; Part Number: 860040881012; Dissipation Factor: 9%; Endurance: 10000h; Leakage Current: 470uA; Ripple Current max.: 1600mA; Technical Reference: ATDL315471M100DSPAEK000; ComponentLink1Description: Manufacturer; ComponentLink1URL: http://www.we-online.de; ComponentLink2Description: Datasheet; ComponentLink2URL: https://katalog.we-online.com/pbs/datasheet/860040881012.pdf; Length: 31.5mm; Mounting Technology: THT; Operating Temperature: -40 to +105degC; Packaging: Ammo Pack; Published Date: August 2019; Capacitance: 470uF; Diameter: 18mm; Publisher: Wurth Elektronik; Capacitance Tolerance: +/-20%; Rated Voltage: 100VDC
footprint WCAP-ATUL_18x31.5
pins: 1 N, 2 P

## 860040881013
designator C?, comment 680uF, 100V
WCAP-ATUL THT Aluminum Electrolytic Capacitors, D18mm x L35.5mm, 680uF, +/-20%, 100VDC; Part Number: 860040881013; Dissipation Factor: 9%; Endurance: 10000h; Leakage Current: 680uA; Ripple Current max.: 1720mA; Technical Reference: ATDL355681M100DSPAEK000; ComponentLink1Description: Manufacturer; ComponentLink1URL: http://www.we-online.de; ComponentLink2Description: Datasheet; ComponentLink2URL: https://katalog.we-online.com/pbs/datasheet/860040881013.pdf; Length: 35.5mm; Mounting Technology: THT; Operating Temperature: -40 to +105degC; Packaging: Ammo Pack; Published Date: August 2019; Capacitance: 680uF; Diameter: 18mm; Publisher: Wurth Elektronik; Capacitance Tolerance: +/-20%; Rated Voltage: 100VDC
footprint WCAP-ATUL_18x35.5
pins: 1 N, 2 P

## 860040881014
designator C?, comment 820uF, 100V
WCAP-ATUL THT Aluminum Electrolytic Capacitors, D18mm x L41mm, 820uF, +/-20%, 100VDC; Part Number: 860040881014; Dissipation Factor: 9%; Endurance: 10000h; Leakage Current: 820uA; Ripple Current max.: 2340mA; Technical Reference: ATDL410821M100DSPS1K000; ComponentLink1Description: Manufacturer; ComponentLink1URL: http://www.we-online.de; ComponentLink2Description: Datasheet; ComponentLink2URL: https://katalog.we-online.com/pbs/datasheet/860040881014.pdf; Length: 41mm; Mounting Technology: THT; Operating Temperature: -40 to +105degC; Packaging: Ammo Pack; Published Date: August 2019; Capacitance: 820uF; Diameter: 18mm; Publisher: Wurth Elektronik; Capacitance Tolerance: +/-20%; Rated Voltage: 100VDC
footprint WCAP-ATUL_18x41
pins: 1 N, 2 P